# Altium integrated library WE-CMBNC_rev15b.intlib: 36 symbols
Pins are listed as number, name and electrical type; pins without a type are passive.

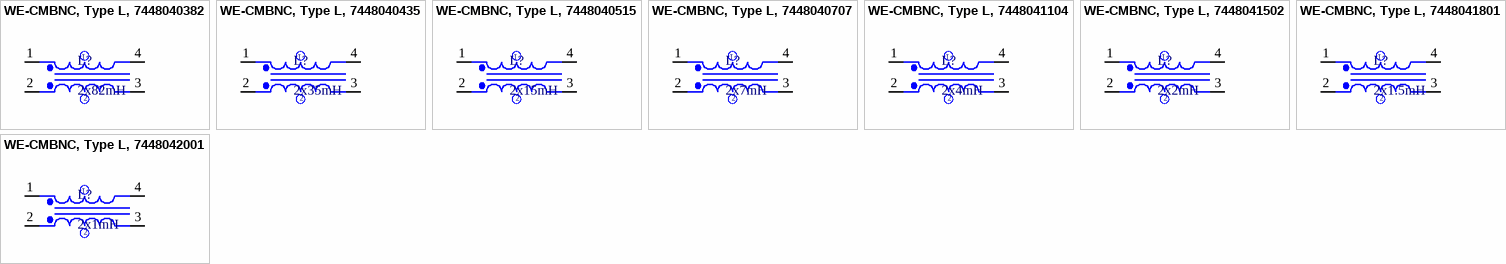
[diagram p0: symbols WE-CMBNC, Type L, 7448040382 to WE-CMBNC, Type L, 7448042001]

## WE-CMBNC, Type L, 7448040382
designator L?, comment 2x82mH
THT Common Mode Power Line  Choke WE-CMBNC , L=2x82mH; PartNo: 7448040382; Manufacturer: Würth Elektronik eiSos GmbH; Inductance: 2x82mH; ComponentLink1Description: Manufacturer; ComponentLink1URL: http://www.we-online.de; Created by: Christin Otto; Created Date: Oct-2014; ComponentLink2Description: Datasheet; ComponentLink2URL: http://katalog.we-online.de/pbs/datasheet/7448042001.pdfhttp://katalog.we-online.de/pbs/datasheet/7448042001.pdfhttp://katalog.we-online.de/pbs/datasheet/7448042001.pdfhttp://katalog.we-online.de/pbs/datasheet/7448040382.pdf
footprint TYPE L-7448040382 (THT-4pin- Body 28mmx19mm)
pins: 1, 2, 3, 4

## WE-CMBNC, Type L, 7448040435
designator L?, comment 2x35mH
THT Common Mode Power Line  Choke WE-CMBNC , L=2x35mH; PartNo: 7448040435; Manufacturer: Würth Elektronik eiSos GmbH; Inductance: 2x35mH; ComponentLink1Description: Manufacturer; ComponentLink1URL: http://www.we-online.de; Created by: Christin Otto; Created Date: Oct-2014; ComponentLink2Description: Datasheet; ComponentLink2URL: http://katalog.we-online.de/pbs/datasheet/7448042001.pdfhttp://katalog.we-online.de/pbs/datasheet/7448042001.pdfhttp://katalog.we-online.de/pbs/datasheet/7448042001.pdfhttp://katalog.we-online.de/pbs/datasheet/7448040435.pdf
footprint TYPE L-7448040435 (THT-4pin- Body 28mmx19mm)
pins: 1, 2, 3, 4

## WE-CMBNC, Type L, 7448040515
designator L?, comment 2x15mH
THT Common Mode Power Line  Choke WE-CMBNC , L=2x15mH; PartNo: 7448040515; Manufacturer: Würth Elektronik eiSos GmbH; Inductance: 2x15mH; ComponentLink1Description: Manufacturer; ComponentLink1URL: http://www.we-online.de; Created by: Christin Otto; Created Date: Oct-2014; ComponentLink2Description: Datasheet; ComponentLink2URL: http://katalog.we-online.de/pbs/datasheet/7448042001.pdfhttp://katalog.we-online.de/pbs/datasheet/7448042001.pdfhttp://katalog.we-online.de/pbs/datasheet/7448042001.pdfhttp://katalog.we-online.de/pbs/datasheet/7448040515.pdf
footprint TYPE L-7448040515 (THT-4pin- Body 28mmx19mm)
pins: 1, 2, 3, 4

## WE-CMBNC, Type L, 7448040707
designator L?, comment 2x7mH
THT Common Mode Power Line  Choke WE-CMBNC , L=2x7mH; PartNo: 7448040707; Manufacturer: Würth Elektronik eiSos GmbH; Inductance: 2x7mH; ComponentLink1Description: Manufacturer; ComponentLink1URL: http://www.we-online.de; Created by: Christin Otto; Created Date: Oct-2014; ComponentLink2Description: Datasheet; ComponentLink2URL: http://katalog.we-online.de/pbs/datasheet/7448042001.pdfhttp://katalog.we-online.de/pbs/datasheet/7448042001.pdfhttp://katalog.we-online.de/pbs/datasheet/7448042001.pdfhttp://katalog.we-online.de/pbs/datasheet/7448040707.pdf
footprint TYPE L-7448040707 (THT-4pin- Body 28mmx19mm)
pins: 1, 2, 3, 4

## WE-CMBNC, Type L, 7448041104
designator L?, comment 2x4mH
THT Common Mode Power Line  Choke WE-CMBNC , L=2x4mH; PartNo: 7448041104; Manufacturer: Würth Elektronik eiSos GmbH; Inductance: 2x4mH; ComponentLink1Description: Manufacturer; ComponentLink1URL: http://www.we-online.de; Created by: Christin Otto; Created Date: Oct-2014; ComponentLink2Description: Datasheet; ComponentLink2URL: http://katalog.we-online.de/pbs/datasheet/7448042001.pdfhttp://katalog.we-online.de/pbs/datasheet/7448042001.pdfhttp://katalog.we-online.de/pbs/datasheet/7448042001.pdfhttp://katalog.we-online.de/pbs/datasheet/7448041104.pdf
footprint TYPE L-7448041104 (THT-4pin- Body 28mmx19mm)
pins: 1, 2, 3, 4

## WE-CMBNC, Type L, 7448041502
designator L?, comment 2x2mH
THT Common Mode Power Line  Choke WE-CMBNC , L=2x2mH; PartNo: 7448041502; Manufacturer: Würth Elektronik eiSos GmbH; Inductance: 2x2mH; ComponentLink1Description: Manufacturer; ComponentLink1URL: http://www.we-online.de; Created by: Christin Otto; Created Date: Oct-2014; ComponentLink2Description: Datasheet; ComponentLink2URL: http://katalog.we-online.de/pbs/datasheet/7448042001.pdfhttp://katalog.we-online.de/pbs/datasheet/7448042001.pdfhttp://katalog.we-online.de/pbs/datasheet/7448042001.pdfhttp://katalog.we-online.de/pbs/datasheet/7448041502.pdf
footprint TYPE L-7448041502 (THT-4pin- Body 30x19mm)
pins: 1, 2, 3, 4

## WE-CMBNC, Type L, 7448041801
designator L?, comment 2x1.5mH
THT Common Mode Power Line  Choke WE-CMBNC , L=2x1.5mH; PartNo: 7448041801; Manufacturer: Würth Elektronik eiSos GmbH; Inductance: 2x1.5mH; ComponentLink1Description: Manufacturer; ComponentLink1URL: http://www.we-online.de; Created by: Christin Otto; Created Date: Oct-2014; ComponentLink2Description: Datasheet; ComponentLink2URL: http://katalog.we-online.de/pbs/datasheet/7448042001.pdfhttp://katalog.we-online.de/pbs/datasheet/7448042001.pdfhttp://katalog.we-online.de/pbs/datasheet/7448042001.pdfhttp://katalog.we-online.de/pbs/datasheet/7448041801.pdf
footprint TYPE L-7448041801 (THT-4pin- Body 30x19mm)
pins: 1, 2, 3, 4

## WE-CMBNC, Type L, 7448042001
designator L?, comment 2x1mH
THT Common Mode Power Line  Choke WE-CMBNC , L=2x1mH; PartNo: 7448042001; Manufacturer: Würth Elektronik eiSos GmbH; Inductance: 2x1mH; ComponentLink1Description: Manufacturer; ComponentLink1URL: http://www.we-online.de; Created by: Christin Otto; Created Date: Oct-2014; ComponentLink2Description: Datasheet; ComponentLink2URL: http://katalog.we-online.de/pbs/datasheet/7448042001.pdfhttp://katalog.we-online.de/pbs/datasheet/7448042001.pdfhttp://katalog.we-online.de/pbs/datasheet/7448042001.pdfhttp://katalog.we-online.de/pbs/datasheet/7448042001.pdf
footprint TYPE L-7448042001 (THT-4pin- Body 30x19mm)
pins: 1, 2, 3, 4


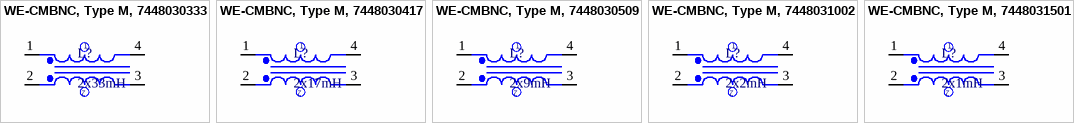
[diagram p1: symbols WE-CMBNC, Type M, 7448030333 to WE-CMBNC, Type M, 7448031501]

## WE-CMBNC, Type M, 7448030333
designator L?, comment 2x33mH
THT Common Mode Power Line  Choke WE-CMBNC , L=2x33mH; PartNo: 7448030333; Manufacturer: Würth Elektronik eiSos GmbH; Inductance: 2x33mH; ComponentLink1Description: Manufacturer; ComponentLink1URL: http://www.we-online.de; Created by: Christin Otto; Created Date: Oct-2014; ComponentLink2Description: Datasheet; ComponentLink2URL: http://katalog.we-online.de/pbs/datasheet/7448042001.pdfhttp://katalog.we-online.de/pbs/datasheet/7448042001.pdfhttp://katalog.we-online.de/pbs/datasheet/7448042001.pdfhttp://katalog.we-online.de/pbs/datasheet/7448030333.pdf
footprint TYPE M-7448030333 (THT-4pin- Body 22x13.5mm)
pins: 1, 2, 3, 4

## WE-CMBNC, Type M, 7448030417
designator L?, comment 2x17mH
THT Common Mode Power Line  Choke WE-CMBNC , L=2x17mH; PartNo: 7448030417; Manufacturer: Würth Elektronik eiSos GmbH; Inductance: 2x17mH; ComponentLink1Description: Manufacturer; ComponentLink1URL: http://www.we-online.de; Created by: Christin Otto; Created Date: Oct-2014; ComponentLink2Description: Datasheet; ComponentLink2URL: http://katalog.we-online.de/pbs/datasheet/7448042001.pdfhttp://katalog.we-online.de/pbs/datasheet/7448042001.pdfhttp://katalog.we-online.de/pbs/datasheet/7448042001.pdfhttp://katalog.we-online.de/pbs/datasheet/7448030417.pdf
footprint TYPE M-7448030509 (THT-4pin- Body 22x13.5mm)
pins: 1, 2, 3, 4

## WE-CMBNC, Type M, 7448030509
designator L?, comment 2x9mH
THT Common Mode Power Line  Choke WE-CMBNC , L=2x9mH; PartNo: 7448030509; Manufacturer: Würth Elektronik eiSos GmbH; Inductance: 2x9mH; ComponentLink1Description: Manufacturer; ComponentLink1URL: http://www.we-online.de; Created by: Christin Otto; Created Date: Oct-2014; ComponentLink2Description: Datasheet; ComponentLink2URL: http://katalog.we-online.de/pbs/datasheet/7448042001.pdfhttp://katalog.we-online.de/pbs/datasheet/7448042001.pdfhttp://katalog.we-online.de/pbs/datasheet/7448042001.pdfhttp://katalog.we-online.de/pbs/datasheet/7448030509.pdf
footprint TYPE M-7448030509 (THT-4pin- Body 22x13.5mm)
pins: 1, 2, 3, 4

## WE-CMBNC, Type M, 7448031002
designator L?, comment 2x2mH
THT Common Mode Power Line  Choke WE-CMBNC , L=2x2mH; PartNo: 7448031002; Manufacturer: Würth Elektronik eiSos GmbH; Inductance: 2x2mH; ComponentLink1Description: Manufacturer; ComponentLink1URL: http://www.we-online.de; Created by: Christin Otto; Created Date: Oct-2014; ComponentLink2Description: Datasheet; ComponentLink2URL: http://katalog.we-online.de/pbs/datasheet/7448042001.pdfhttp://katalog.we-online.de/pbs/datasheet/7448042001.pdfhttp://katalog.we-online.de/pbs/datasheet/7448042001.pdfhttp://katalog.we-online.de/pbs/datasheet/7448031002.pdf
footprint Type M-7448031002 (THT-4pin- Body 23x17mm)
pins: 1, 2, 3, 4

## WE-CMBNC, Type M, 7448031501
designator L?, comment 2x1mH
THT Common Mode Power Line  Choke WE-CMBNC , L=2x1mH; PartNo: 7448031501; Manufacturer: Würth Elektronik eiSos GmbH; Inductance: 2x1mH; ComponentLink1Description: Manufacturer; ComponentLink1URL: http://www.we-online.de; Created by: Christin Otto; Created Date: Oct-2014; ComponentLink2Description: Datasheet; ComponentLink2URL: http://katalog.we-online.de/pbs/datasheet/7448042001.pdfhttp://katalog.we-online.de/pbs/datasheet/7448042001.pdfhttp://katalog.we-online.de/pbs/datasheet/7448042001.pdfhttp://katalog.we-online.de/pbs/datasheet/7448031501.pdf
footprint Type M-7448031501 (THT-4pin- Body 23x17mm)
pins: 1, 2, 3, 4


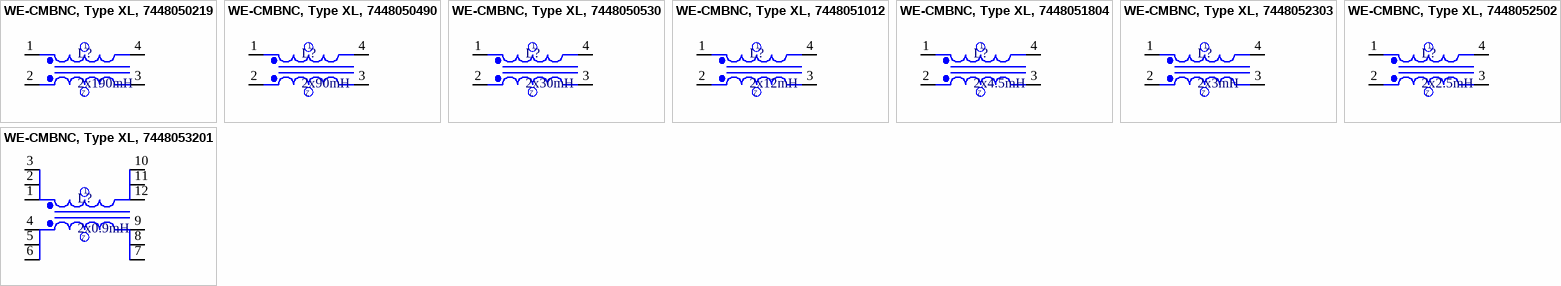
[diagram p2: symbols WE-CMBNC, Type XL, 7448050219 to WE-CMBNC, Type XL, 7448053201]

## WE-CMBNC, Type XL, 7448050219
designator L?, comment 2x190mH
THT Common Mode Power Line  Choke WE-CMBNC , L=2x190mH; PartNo: 7448050219; Manufacturer: Würth Elektronik eiSos GmbH; Inductance: 2x190mH; ComponentLink1Description: Manufacturer; ComponentLink1URL: http://www.we-online.de; Created by: Christin Otto; Created Date: Oct-2014; ComponentLink2Description: Datasheet; ComponentLink2URL: http://katalog.we-online.de/pbs/datasheet/7448042001.pdfhttp://katalog.we-online.de/pbs/datasheet/7448042001.pdfhttp://katalog.we-online.de/pbs/datasheet/7448042001.pdfhttp://katalog.we-online.de/pbs/datasheet/7448050219.pdf
footprint TYPE XL-7448050219 (THT-4pin- Body 33mmx19mm)
pins: 1, 2, 3, 4

## WE-CMBNC, Type XL, 7448050490
designator L?, comment 2x90mH
THT Common Mode Power Line  Choke WE-CMBNC , L=2x90mH; PartNo: 7448050490; Manufacturer: Würth Elektronik eiSos GmbH; Inductance: 2x90mH; ComponentLink1Description: Manufacturer; ComponentLink1URL: http://www.we-online.de; Created by: Christin Otto; Created Date: Oct-2014; ComponentLink2Description: Datasheet; ComponentLink2URL: http://katalog.we-online.de/pbs/datasheet/7448042001.pdfhttp://katalog.we-online.de/pbs/datasheet/7448042001.pdfhttp://katalog.we-online.de/pbs/datasheet/7448042001.pdfhttp://katalog.we-online.de/pbs/datasheet/7448050490.pdf
footprint TYPE XL-7448050490 (THT-4pin- Body 33mmx19mm)
pins: 1, 2, 3, 4

## WE-CMBNC, Type XL, 7448050530
designator L?, comment 2x30mH
THT Common Mode Power Line  Choke WE-CMBNC , L=2x30mH; PartNo: 7448050530; Manufacturer: Würth Elektronik eiSos GmbH; Inductance: 2x30mH; ComponentLink1Description: Manufacturer; ComponentLink1URL: http://www.we-online.de; Created by: Christin Otto; Created Date: Oct-2014; ComponentLink2Description: Datasheet; ComponentLink2URL: http://katalog.we-online.de/pbs/datasheet/7448042001.pdfhttp://katalog.we-online.de/pbs/datasheet/7448042001.pdfhttp://katalog.we-online.de/pbs/datasheet/7448042001.pdfhttp://katalog.we-online.de/pbs/datasheet/7448050530.pdf
footprint TYPE XL-7448050530 (THT-4pin- Body 33mmx23mm)
pins: 1, 2, 3, 4

## WE-CMBNC, Type XL, 7448051012
designator L?, comment 2x12mH
THT Common Mode Power Line  Choke WE-CMBNC , L=2x12mH; PartNo: 7448051012; Manufacturer: Würth Elektronik eiSos GmbH; Inductance: 2x12mH; ComponentLink1Description: Manufacturer; ComponentLink1URL: http://www.we-online.de; Created by: Christin Otto; Created Date: Oct-2014; ComponentLink2Description: Datasheet; ComponentLink2URL: http://katalog.we-online.de/pbs/datasheet/7448042001.pdfhttp://katalog.we-online.de/pbs/datasheet/7448042001.pdfhttp://katalog.we-online.de/pbs/datasheet/7448042001.pdfhttp://katalog.we-online.de/pbs/datasheet/7448051012.pdf
footprint TYPE XL-7448051012 (THT-4pin- Body 34mmx23mm)
pins: 1, 2, 3, 4

## WE-CMBNC, Type XL, 7448051804
designator L?, comment 2x4.5mH
THT Common Mode Power Line  Choke WE-CMBNC , L=2x4.5mH; PartNo: 7448051804; Manufacturer: Würth Elektronik eiSos GmbH; Inductance: 2x4.5mH; ComponentLink1Description: Manufacturer; ComponentLink1URL: http://www.we-online.de; Created by: Christin Otto; Created Date: Oct-2014; ComponentLink2Description: Datasheet; ComponentLink2URL: http://katalog.we-online.de/pbs/datasheet/7448042001.pdfhttp://katalog.we-online.de/pbs/datasheet/7448042001.pdfhttp://katalog.we-online.de/pbs/datasheet/7448042001.pdfhttp://katalog.we-online.de/pbs/datasheet/7448051804.pdf
footprint TYPE XL-7448051804 (THT-4pin- Body 36mmx23mm)
pins: 1, 2, 3, 4

## WE-CMBNC, Type XL, 7448052303
designator L?, comment 2x3mH
THT Common Mode Power Line  Choke WE-CMBNC , L=2x3mH; PartNo: 7448052303; Manufacturer: Würth Elektronik eiSos GmbH; Inductance: 2x3mH; ComponentLink1Description: Manufacturer; ComponentLink1URL: http://www.we-online.de; Created by: Christin Otto; Created Date: Oct-2014; ComponentLink2Description: Datasheet; ComponentLink2URL: http://katalog.we-online.de/pbs/datasheet/7448042001.pdfhttp://katalog.we-online.de/pbs/datasheet/7448042001.pdfhttp://katalog.we-online.de/pbs/datasheet/7448042001.pdfhttp://katalog.we-online.de/pbs/datasheet/7448052303.pdf
footprint TYPE XL-7448052303 (THT-4pin- Body 36mmx23mm)
pins: 1, 2, 3, 4

## WE-CMBNC, Type XL, 7448052502
designator L?, comment 2x2.5mH
THT Common Mode Power Line  Choke WE-CMBNC , L=2x2.5mH; PartNo: 7448052502; Manufacturer: Würth Elektronik eiSos GmbH; Inductance: 2x2.5mH; ComponentLink1Description: Manufacturer; ComponentLink1URL: http://www.we-online.de; Created by: Christin Otto; Created Date: Oct-2014; ComponentLink2Description: Datasheet; ComponentLink2URL: http://katalog.we-online.de/pbs/datasheet/7448042001.pdfhttp://katalog.we-online.de/pbs/datasheet/7448042001.pdfhttp://katalog.we-online.de/pbs/datasheet/7448042001.pdfhttp://katalog.we-online.de/pbs/datasheet/7448052502.pdf
footprint TYPE XL-7448052502 (THT-4pin- Body 36mmx23mm)
pins: 1, 2, 3, 4

## WE-CMBNC, Type XL, 7448053201
designator L?, comment 2x0.9mH
THT Common Mode Power Line  Choke WE-CMBNC , L=2x0.9mH; PartNo: 7448053201; Manufacturer: Würth Elektronik eiSos GmbH; Inductance: 2x0.9mH; ComponentLink1Description: Manufacturer; ComponentLink1URL: http://www.we-online.de; Created by: Christin Otto; Created Date: Oct-2014; ComponentLink2Description: Datasheet; ComponentLink2URL: http://katalog.we-online.de/pbs/datasheet/7448042001.pdfhttp://katalog.we-online.de/pbs/datasheet/7448042001.pdfhttp://katalog.we-online.de/pbs/datasheet/7448042001.pdfhttp://katalog.we-online.de/pbs/datasheet/7448053201.pdf
footprint TYPE XL-7448053201 (THT-12pin- Body 37mmx23mm)
pins: 1, 2, 3, 4, 5, 6, 7, 8, 9, 10, 11, 12


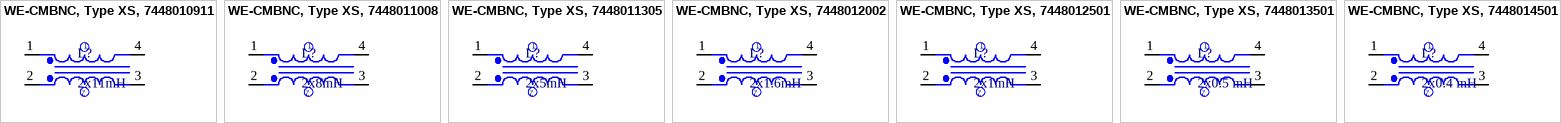
[diagram p3: symbols WE-CMBNC, Type XS, 7448010911 to WE-CMBNC, Type XS, 7448014501]

## WE-CMBNC, Type XS, 7448010911
designator L?, comment 2x11mH
THT Common Mode Power Line  Choke, WE-CMBNC , L=2x11mH; PartNo: 7448010911; Manufacturer: Würth Elektronik eiSos GmbH; Inductance: 2x11mH; ComponentLink1Description: Manufacturer; ComponentLink1URL: http://www.we-online.de; Created by: Christin Otto; Created Date: Oct-2014; ComponentLink2Description: Datasheet; ComponentLink2URL: http://katalog.we-online.de/pbs/datasheet/7448042001.pdfhttp://katalog.we-online.de/pbs/datasheet/7448042001.pdfhttp://katalog.we-online.de/pbs/datasheet/7448042001.pdfhttp://katalog.we-online.de/pbs/datasheet/7448010911.pdf
footprint Type XS-7448010911 (THT-4pin- Body 14x7.5mm)
pins: 1, 2, 3, 4

## WE-CMBNC, Type XS, 7448011008
designator L?, comment 2x8mH
THT Common Mode Power Line  Choke, WE-CMBNC , L=2x8mH; PartNo: 7448011008; Manufacturer: Würth Elektronik eiSos GmbH; Inductance: 2x8mH; ComponentLink1Description: Manufacturer; ComponentLink1URL: http://www.we-online.de; Created by: Christin Otto; Created Date: Oct-2014; ComponentLink2Description: Datasheet; ComponentLink2URL: http://katalog.we-online.de/pbs/datasheet/7448042001.pdfhttp://katalog.we-online.de/pbs/datasheet/7448042001.pdfhttp://katalog.we-online.de/pbs/datasheet/7448042001.pdfhttp://katalog.we-online.de/pbs/datasheet/7448011008.pdf
footprint Type XS-7448011008 (THT-4pin- Body 14x7.5mm)
pins: 1, 2, 3, 4

## WE-CMBNC, Type XS, 7448011305
designator L?, comment 2x5mH
THT Common Mode Power Line  Choke, WE-CMBNC , L=2x5mH; PartNo: 7448011305; Manufacturer: Würth Elektronik eiSos GmbH; Inductance: 2x5mH; ComponentLink1Description: Manufacturer; ComponentLink1URL: http://www.we-online.de; Created by: Christin Otto; Created Date: Oct-2014; ComponentLink2Description: Datasheet; ComponentLink2URL: http://katalog.we-online.de/pbs/datasheet/7448042001.pdfhttp://katalog.we-online.de/pbs/datasheet/7448042001.pdfhttp://katalog.we-online.de/pbs/datasheet/7448042001.pdfhttp://katalog.we-online.de/pbs/datasheet/7448011305.pdf
footprint Type XS-7448011305 (THT-4pin- Body 14x7.5mm)
pins: 1, 2, 3, 4

## WE-CMBNC, Type XS, 7448012002
designator L?, comment 2x1.6mH
THT Common Mode Power Line  Choke WE-CMBNC , L=2x1.6mH; PartNo: 7448012002; Manufacturer: Würth Elektronik eiSos GmbH; Inductance: 2x1.6mH; ComponentLink1Description: Manufacturer; ComponentLink1URL: http://www.we-online.de; Created by: Christin Otto; Created Date: Oct-2014; ComponentLink2Description: Datasheet; ComponentLink2URL: http://katalog.we-online.de/pbs/datasheet/7448042001.pdfhttp://katalog.we-online.de/pbs/datasheet/7448042001.pdfhttp://katalog.we-online.de/pbs/datasheet/7448042001.pdfhttp://katalog.we-online.de/pbs/datasheet/7448012002.pdf
footprint Type XS-7448012002 (THT-4pin- Body 14x7.5mm)
pins: 1, 2, 3, 4

## WE-CMBNC, Type XS, 7448012501
designator L?, comment 2x1mH
THT Common Mode Power Line  Choke WE-CMBNC , L=2x1mH; PartNo: 7448012501; Manufacturer: Würth Elektronik eiSos GmbH; Inductance: 2x1mH; ComponentLink1Description: Manufacturer; ComponentLink1URL: http://www.we-online.de; Created by: Christin Otto; Created Date: Oct-2014; ComponentLink2Description: Datasheet; ComponentLink2URL: http://katalog.we-online.de/pbs/datasheet/7448042001.pdfhttp://katalog.we-online.de/pbs/datasheet/7448042001.pdfhttp://katalog.we-online.de/pbs/datasheet/7448042001.pdfhttp://katalog.we-online.de/pbs/datasheet/7448012501.pdf
footprint Type XS-7448012501 (THT-4pin- Body 15x7.5mm)
pins: 1, 2, 3, 4

## WE-CMBNC, Type XS, 7448013501
designator L?, comment 2x0.5 mH
THT Common Mode Power Line  Choke , WE-CMBNC, L=2x0.5mH; PartNo: 7448013501; Manufacturer: Würth Elektronik eiSos GmbH; Inductance: 2x0.5 mH; ComponentLink1Description: Manufacturer; ComponentLink1URL: http://www.we-online.de; Created by: Christin Otto; Created Date: Oct-2014; ComponentLink2Description: Datasheet; ComponentLink2URL: http://katalog.we-online.de/pbs/datasheet/7448042001.pdfhttp://katalog.we-online.de/pbs/datasheet/7448042001.pdfhttp://katalog.we-online.de/pbs/datasheet/7448042001.pdfhttp://katalog.we-online.de/pbs/datasheet/7448013501.pdf
footprint Type XS-7448013501 (THT-4pin- Body 15x7.5mm)
pins: 1, 2, 3, 4

## WE-CMBNC, Type XS, 7448014501
designator L?, comment 2x0.4 mH
THT Common Mode Power Line  Choke WE-CMBNC , L=2x0.4mH; PartNo: 7448014501; Manufacturer: Würth Elektronik eiSos GmbH; Inductance: 2x0.4 mH; ComponentLink1Description: Manufacturer; ComponentLink1URL: http://www.we-online.de; Created by: Christin Otto; Created Date: Oct-2014; ComponentLink2Description: Datasheet; ComponentLink2URL: http://katalog.we-online.de/pbs/datasheet/7448042001.pdfhttp://katalog.we-online.de/pbs/datasheet/7448042001.pdfhttp://katalog.we-online.de/pbs/datasheet/7448042001.pdfhttp://katalog.we-online.de/pbs/datasheet/7448014501.pdf
footprint Type XS-7448014501 (THT-3pin- Body 14x7.5mm)
pins: 1, 2, 3, 4


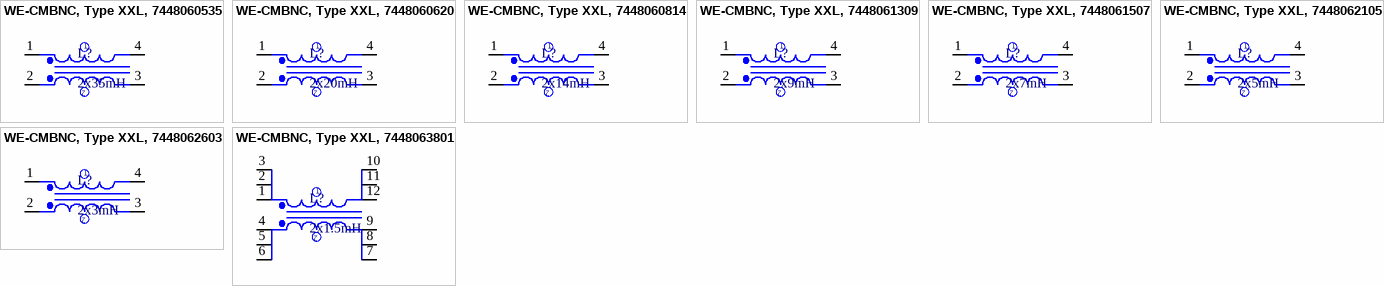
[diagram p4: symbols WE-CMBNC, Type XXL, 7448060535 to WE-CMBNC, Type XXL, 7448063801]

## WE-CMBNC, Type XXL, 7448060535
designator L?, comment 2x35mH
THT Common Mode Power Line  Choke WE-CMBNC , L=2x35mH; PartNo: 7448060535; Manufacturer: Würth Elektronik eiSos GmbH; Inductance: 2x35mH; ComponentLink1Description: Manufacturer; ComponentLink1URL: http://www.we-online.de; Created by: Christin Otto; Created Date: Oct-2014; ComponentLink2Description: Datasheet; ComponentLink2URL: http://katalog.we-online.de/pbs/datasheet/7448042001.pdfhttp://katalog.we-online.de/pbs/datasheet/7448042001.pdfhttp://katalog.we-online.de/pbs/datasheet/7448042001.pdfhttp://katalog.we-online.de/pbs/datasheet/7448060535.pdf
footprint TYPE XXL-7448060535 (THT-4pin- Body 42mmx27mm)
pins: 1, 2, 3, 4

## WE-CMBNC, Type XXL, 7448060620
designator L?, comment 2x20mH
THT Common Mode Power Line  Choke WE-CMBNC , L=2x20mH; PartNo: 7448060620; Manufacturer: Würth Elektronik eiSos GmbH; Inductance: 2x20mH; ComponentLink1Description: Manufacturer; ComponentLink1URL: http://www.we-online.de; Created by: Christin Otto; Created Date: Oct-2014; ComponentLink2Description: Datasheet; ComponentLink2URL: http://katalog.we-online.de/pbs/datasheet/7448042001.pdfhttp://katalog.we-online.de/pbs/datasheet/7448042001.pdfhttp://katalog.we-online.de/pbs/datasheet/7448042001.pdfhttp://katalog.we-online.de/pbs/datasheet/7448060620.pdf
footprint TYPE XXL-7448060620 (THT-4pin- Body 42mmx27mm)
pins: 1, 2, 3, 4

## WE-CMBNC, Type XXL, 7448060814
designator L?, comment 2x14mH
THT Common Mode Power Line  Choke WE-CMBNC , L=2x14mH; PartNo: 7448060814; Manufacturer: Würth Elektronik eiSos GmbH; Inductance: 2x14mH; ComponentLink1Description: Manufacturer; ComponentLink1URL: http://www.we-online.de; Created by: Christin Otto; Created Date: Oct-2014; ComponentLink2Description: Datasheet; ComponentLink2URL: http://katalog.we-online.de/pbs/datasheet/7448042001.pdfhttp://katalog.we-online.de/pbs/datasheet/7448042001.pdfhttp://katalog.we-online.de/pbs/datasheet/7448042001.pdfhttp://katalog.we-online.de/pbs/datasheet/7448060814.pdf
footprint TYPE XXL-7448060814 (THT-4pin- Body 43mmx27mm)
pins: 1, 2, 3, 4

## WE-CMBNC, Type XXL, 7448061309
designator L?, comment 2x9mH
THT Common Mode Power Line  Choke WE-CMBNC , L=2x9mH; PartNo: 7448061309; Manufacturer: Würth Elektronik eiSos GmbH; Inductance: 2x9mH; ComponentLink1Description: Manufacturer; ComponentLink1URL: http://www.we-online.de; Created by: Christin Otto; Created Date: Oct-2014; ComponentLink2Description: Datasheet; ComponentLink2URL: http://katalog.we-online.de/pbs/datasheet/7448042001.pdfhttp://katalog.we-online.de/pbs/datasheet/7448042001.pdfhttp://katalog.we-online.de/pbs/datasheet/7448042001.pdfhttp://katalog.we-online.de/pbs/datasheet/7448061309.pdf
footprint TYPE XXL-7448061309 (THT-4pin- Body 44mmx27mm)
pins: 1, 2, 3, 4

## WE-CMBNC, Type XXL, 7448061507
designator L?, comment 2x7mH
THT Common Mode Power Line  Choke WE-CMBNC , L=2x7mH; PartNo: 7448061507; Manufacturer: Würth Elektronik eiSos GmbH; Inductance: 2x7mH; ComponentLink1Description: Manufacturer; ComponentLink1URL: http://www.we-online.de; Created by: Christin Otto; Created Date: Oct-2014; ComponentLink2Description: Datasheet; ComponentLink2URL: http://katalog.we-online.de/pbs/datasheet/7448042001.pdfhttp://katalog.we-online.de/pbs/datasheet/7448042001.pdfhttp://katalog.we-online.de/pbs/datasheet/7448042001.pdfhttp://katalog.we-online.de/pbs/datasheet/7448061507.pdf
footprint TYPE XXL-7448061507 (THT-4pin- Body 46mmx27mm)
pins: 1, 2, 3, 4

## WE-CMBNC, Type XXL, 7448062105
designator L?, comment 2x5mH
THT Common Mode Power Line  Choke WE-CMBNC , L=2x5mH; PartNo: 7448062105; Manufacturer: Würth Elektronik eiSos GmbH; Inductance: 2x5mH; ComponentLink1Description: Manufacturer; ComponentLink1URL: http://www.we-online.de; Created by: Christin Otto; Created Date: Oct-2014; ComponentLink2Description: Datasheet; ComponentLink2URL: http://katalog.we-online.de/pbs/datasheet/7448042001.pdfhttp://katalog.we-online.de/pbs/datasheet/7448042001.pdfhttp://katalog.we-online.de/pbs/datasheet/7448042001.pdfhttp://katalog.we-online.de/pbs/datasheet/7448062105.pdf
footprint TYPE XXL-7448062105 (THT-4pin- Body 46mmx27mm)
pins: 1, 2, 3, 4

## WE-CMBNC, Type XXL, 7448062603
designator L?, comment 2x3mH
THT Common Mode Power Line  Choke WE-CMBNC , L=2x3mH; PartNo: 7448062603; Manufacturer: Würth Elektronik eiSos GmbH; Inductance: 2x3mH; ComponentLink1Description: Manufacturer; ComponentLink1URL: http://www.we-online.de; Created by: Christin Otto; Created Date: Oct-2014; ComponentLink2Description: Datasheet; ComponentLink2URL: http://katalog.we-online.de/pbs/datasheet/7448042001.pdfhttp://katalog.we-online.de/pbs/datasheet/7448042001.pdfhttp://katalog.we-online.de/pbs/datasheet/7448042001.pdfhttp://katalog.we-online.de/pbs/datasheet/7448062603.pdf
footprint TYPE XXL-7448062603 (THT-4pin- Body 47mmx27mm)
pins: 1, 2, 3, 4

## WE-CMBNC, Type XXL, 7448063801
designator L?, comment 2x1.5mH
THT Common Mode Power Line  Choke WE-CMBNC , L=2x1.5mH; PartNo: 7448063801; Manufacturer: Würth Elektronik eiSos GmbH; Inductance: 2x1.5mH; ComponentLink1Description: Manufacturer; ComponentLink1URL: http://www.we-online.de; Created by: Christin Otto; Created Date: Oct-2014; ComponentLink2Description: Datasheet; ComponentLink2URL: http://katalog.we-online.de/pbs/datasheet/7448042001.pdfhttp://katalog.we-online.de/pbs/datasheet/7448042001.pdfhttp://katalog.we-online.de/pbs/datasheet/7448042001.pdfhttp://katalog.we-online.de/pbs/datasheet/7448063801.pdf
footprint TYPE XXL-7448063801 (THT-12pin- Body 48mmx27mm)
pins: 1, 2, 3, 4, 5, 6, 7, 8, 9, 10, 11, 12